# Altium footprint library mastermind.PCBLIB: 1061 footprints (part 48 of 67)
Each footprint in its own frame and in the unit in brackets; x right, y up, seen from the top. Pads: shape width x height; smd on the part's side, far side on the other; paste and mask are expansions set on the pad; w line width, h text height; cw(c..) or ccw(c..) is an arc to the next point about the centre after c.
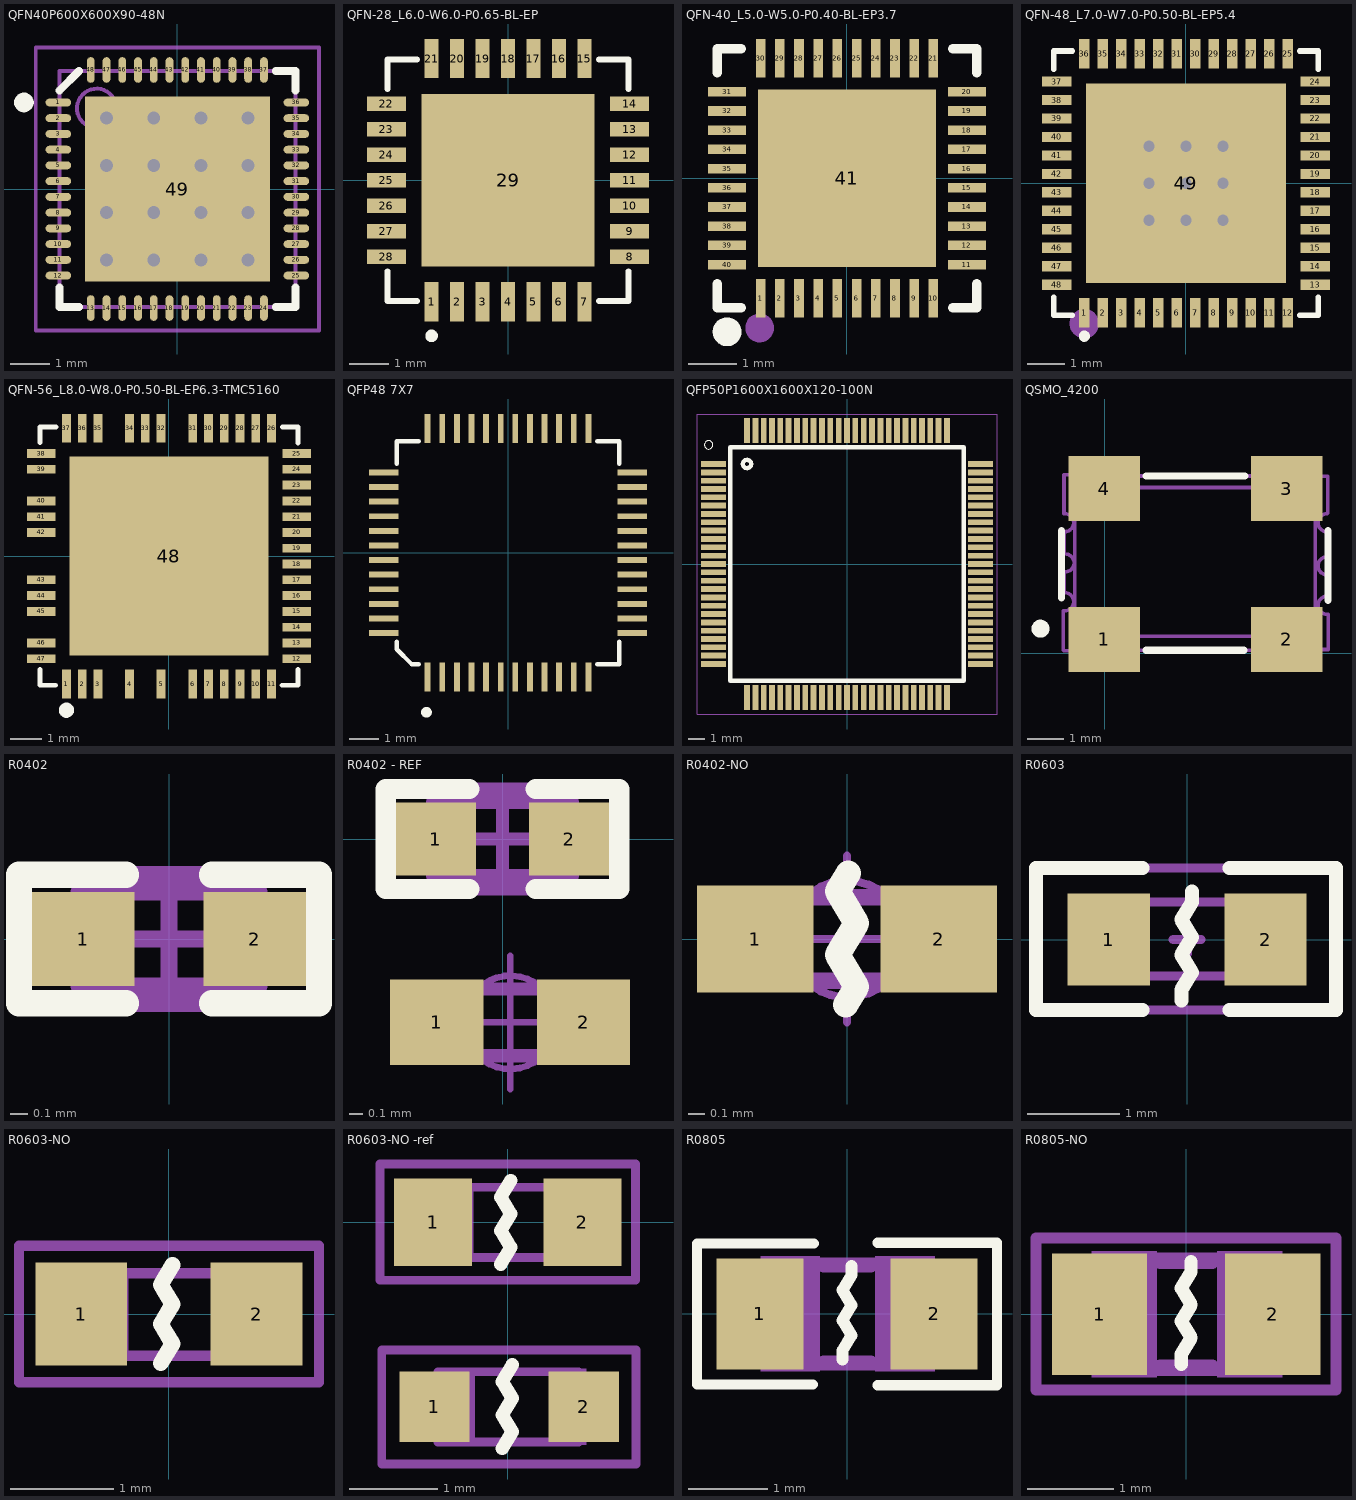
[diagram p47: the footprints below, top view; thin cyan lines are the x and y axes]

## QFN40P600X600X90-48N [mm]
pads (49):
  oval 0.65x0.2 smd: 1(-3.025,2.2) 2(-3.025,1.8) 3(-3.025,1.4) 4(-3.025,1) 5(-3.025,0.6) 6(-3.025,0.2) 7(-3.025,-0.2) 8(-3.025,-0.6) 9(-3.025,-1) 10(-3.025,-1.4) 11(-3.025,-1.8) 12(-3.025,-2.2) 25(3.025,-2.2) 26(3.025,-1.8) 27(3.025,-1.4) 28(3.025,-1) 29(3.025,-0.6) 30(3.025,-0.2) 31(3.025,0.2) 32(3.025,0.6) 33(3.025,1) 34(3.025,1.4) 35(3.025,1.8) 36(3.025,2.2)
  oval 0.2x0.65 smd: 13(-2.2,-3.025) 14(-1.8,-3.025) 15(-1.4,-3.025) 16(-1,-3.025) 17(-0.6,-3.025) 18(-0.2,-3.025) 19(0.2,-3.025) 20(0.6,-3.025) 21(1,-3.025) 22(1.4,-3.025) 23(1.8,-3.025) 24(2.2,-3.025) 37(2.2,3.025) 38(1.8,3.025) 39(1.4,3.025) 40(1,3.025) 41(0.6,3.025) 42(0.2,3.025) 43(-0.2,3.025) 44(-0.6,3.025) 45(-1,3.025) 46(-1.4,3.025) 47(-1.8,3.025) 48(-2.2,3.025)
  rect 4.7x4.7 smd: 49(0,0)
via 1.8,-1.8 diameter 0.66 hole 0.33
via 0.6,-1.8 diameter 0.66 hole 0.33
via -0.6,-1.8 diameter 0.66 hole 0.33
via -1.8,-1.8 diameter 0.66 hole 0.33
via 1.8,-0.6 diameter 0.66 hole 0.33
via 0.6,-0.6 diameter 0.66 hole 0.33
via -0.6,-0.6 diameter 0.66 hole 0.33
via -1.8,-0.6 diameter 0.66 hole 0.33
via 1.8,0.6 diameter 0.66 hole 0.33
via 0.6,0.6 diameter 0.66 hole 0.33
via -0.6,0.6 diameter 0.66 hole 0.33
via -1.8,0.6 diameter 0.66 hole 0.33
via 1.8,1.8 diameter 0.66 hole 0.33
via 0.6,1.8 diameter 0.66 hole 0.33
via -0.6,1.8 diameter 0.66 hole 0.33
via -1.8,1.8 diameter 0.66 hole 0.33
Top Overlay:
  circle w0.25: c-3.9,2.2 r0.125
  lines w0.2: -3,-2.5 -3,-3 -2.5,-3 ; -3,2.5 -2.5,3 ; 2.5,-3 3,-3 3,-2.5 ; 2.5,3 3,3 3,2.5
Mechanical 13:
  circle w0.1: c-2.05,2.05 r0.5
  lines w0.1: -3,-3 3,-3 3,3 -3,3 -3,-3
Mechanical 15:
  lines w0.1: -0.5,0 0.5,0 ; 0,-0.5 0,0.5 ; -3.6,-3.6 3.6,-3.6 3.6,3.6 -3.6,3.6 -3.6,-3.6
3D body "User Library-QFN48.step": height 0.86, standoff -0.01, extent -3.02,-3.02 3.02,3.02

## QFN-28_L6.0-W6.0-P0.65-BL-EP [mm]
pads (29):
  rect 0.364x1 smd: 1(-1.95,-3.1) 2(-1.3,-3.1) 3(-0.65,-3.1) 4(0,-3.1) 5(0.65,-3.1) 6(1.3,-3.1) 7(1.95,-3.1) 15(1.95,3.1) 16(1.3,3.1) 17(0.65,3.1) 18(0,3.1) 19(-0.65,3.1) 20(-1.3,3.1) 21(-1.95,3.1)
  rect 1x0.364 smd: 8(3.1,-1.95) 9(3.1,-1.3) 10(3.1,-0.65) 11(3.1,0) 12(3.1,0.65) 13(3.1,1.3) 14(3.1,1.95) 22(-3.1,1.95) 23(-3.1,1.3) 24(-3.1,0.65) 25(-3.1,0) 26(-3.1,-0.65) 27(-3.1,-1.3) 28(-3.1,-1.95)
  rect 4.4x4.4 smd: 29(0,0)
Top Overlay:
  circle w0.16: c-1.95,-3.97 r0.08
  lines w0.152: -3.076,-2.322 -3.076,-3.076 -2.322,-3.076 ; -3.076,2.322 -3.076,3.076 -2.322,3.076 ; 2.322,-3.076 3.076,-3.076 3.076,-2.322 ; 2.322,3.076 3.076,3.076 3.076,2.322
Mechanical 15:
  circle w0.16: c-1.95,-3.3 r0.08
3D body: height 1, standoff 0, extent -3.078,-3.076 3.076,3.077

## QFN-40_L5.0-W5.0-P0.40-BL-EP3.7 [mm]
pads (41):
  rect 0.2x0.8 smd: 1(-1.8,-2.499) 2(-1.4,-2.499) 3(-1,-2.499) 4(-0.6,-2.499) 5(-0.2,-2.499) 6(0.2,-2.499) 7(0.6,-2.499) 8(1,-2.499) 9(1.4,-2.499) 10(1.8,-2.499) 21(1.8,2.499) 22(1.4,2.499) 23(1,2.499) 24(0.6,2.499) 25(0.2,2.499) 26(-0.2,2.499) 27(-0.6,2.499) 28(-1,2.499) 29(-1.4,2.499) 30(-1.8,2.499)
  rect 0.8x0.2 smd: 11(2.499,-1.8) 12(2.499,-1.4) 13(2.499,-1) 14(2.499,-0.6) 15(2.499,-0.2) 16(2.499,0.2) 17(2.499,0.6) 18(2.499,1) 19(2.499,1.4) 20(2.499,1.8) 31(-2.499,1.8) 32(-2.499,1.4) 33(-2.499,1) 34(-2.499,0.6) 35(-2.499,0.2) 36(-2.499,-0.2) 37(-2.499,-0.6) 38(-2.499,-1) 39(-2.499,-1.4) 40(-2.499,-1.8)
  rect 3.7x3.7 smd: 41(0,0)
Top Overlay:
  lines w0.2: -2.7,-2.2 -2.7,-2.7 -2.2,-2.7 ; -2.7,2.2 -2.7,2.7 -2.2,2.7 ; 2.2,-2.7 2.7,-2.7 2.7,-2.2 ; 2.2,2.7 2.7,2.7 2.7,2.2
  lines w0.3: -2.499,-3.051 ccw(c-2.498,-3.201) -2.497,-3.051
Top Paste:
  drawing of 41 lines, arcs and shapes, not listed
Mechanical 15:
  circle w0.3: c-1.82,-3.12 r0.15
3D body: height 0.8, standoff 0, extent -2.7,-2.7 2.7,2.7

## QFN-48_L7.0-W7.0-P0.50-BL-EP5.4 [mm]
pads (49):
  rect 0.28x0.8 smd: 1(-2.75,-3.5) 2(-2.25,-3.5) 3(-1.75,-3.5) 4(-1.25,-3.5) 5(-0.75,-3.5) 6(-0.25,-3.5) 7(0.25,-3.5) 8(0.75,-3.5) 9(1.25,-3.5) 10(1.75,-3.5) 11(2.25,-3.5) 12(2.75,-3.5) 25(2.75,3.5) 26(2.25,3.5) 27(1.75,3.5) 28(1.25,3.5) 29(0.75,3.5) 30(0.25,3.5) 31(-0.25,3.5) 32(-0.75,3.5) 33(-1.25,3.5) 34(-1.75,3.5) 35(-2.25,3.5) 36(-2.75,3.5)
  rect 0.8x0.28 smd: 13(3.5,-2.75) 14(3.5,-2.25) 15(3.5,-1.75) 16(3.5,-1.25) 17(3.5,-0.75) 18(3.5,-0.25) 19(3.5,0.25) 20(3.5,0.75) 21(3.5,1.25) 22(3.5,1.75) 23(3.5,2.25) 24(3.5,2.75) 37(-3.5,2.75) 38(-3.5,2.25) 39(-3.5,1.75) 40(-3.5,1.25) 41(-3.5,0.75) 42(-3.5,0.25) 43(-3.5,-0.25) 44(-3.5,-0.75) 45(-3.5,-1.25) 46(-3.5,-1.75) 47(-3.5,-2.25) 48(-3.5,-2.75)
  rect 5.4x5.4 smd: 49(0,0)
via 0,-1 diameter 0.61 hole 0.305
via 0,1 diameter 0.61 hole 0.305
via -1,1 diameter 0.61 hole 0.305
via 1,1 diameter 0.61 hole 0.305
via 1,0 diameter 0.61 hole 0.305
via -1,-1 diameter 0.61 hole 0.305
via 1,-1 diameter 0.61 hole 0.305
via -1,0 diameter 0.61 hole 0.305
via 0,0 diameter 0.61 hole 0.305
Top Overlay:
  circle w0.15: c-2.75,-4.14 r0.075
  lines w0.152: -3.576,-3.08 -3.576,-3.576 -3.081,-3.576 ; -3.576,3.08 -3.576,3.576 -3.081,3.576 ; 3.08,-3.576 3.576,-3.576 3.576,-3.08 ; 3.08,3.576 3.576,3.576 3.576,3.08
Top Paste:
  drawing of 49 lines, arcs and shapes, not listed
Mechanical 15:
  circle w0.4: c-2.75,-3.8 r0.2
3D body: height 0.8, standoff 0, extent -3.576,-3.576 3.576,3.576

## QFN-56_L8.0-W8.0-P0.50-BL-EP6.3-TMC5160 [mm]
pads (48):
  rect 0.28x0.905 smd: 1(-3.25,-4.05) 2(-2.75,-4.05) 3(-2.25,-4.05) 4(-1.25,-4.05) 5(-0.25,-4.05) 6(0.75,-4.05) 7(1.25,-4.05) 8(1.75,-4.05) 9(2.25,-4.05) 10(2.75,-4.05) 11(3.25,-4.05) 26(3.25,4.05) 27(2.75,4.05) 28(2.25,4.05) 29(1.75,4.05) 30(1.25,4.05) 31(0.75,4.05) 32(-0.25,4.05) 33(-0.75,4.05) 34(-1.25,4.05) 35(-2.25,4.05) 36(-2.75,4.05) 37(-3.25,4.05)
  rect 0.905x0.28 smd: 12(4.05,-3.25) 13(4.05,-2.75) 14(4.05,-2.25) 15(4.05,-1.75) 16(4.05,-1.25) 17(4.05,-0.75) 18(4.05,-0.25) 19(4.05,0.25) 20(4.05,0.75) 21(4.05,1.25) 22(4.05,1.75) 23(4.05,2.25) 24(4.05,2.75) 25(4.05,3.25) 38(-4.05,3.25) 39(-4.05,2.75) 40(-4.05,1.75) 41(-4.05,1.25) 42(-4.05,0.75) 43(-4.05,-0.75) 44(-4.05,-1.25) 45(-4.05,-1.75) 46(-4.05,-2.75) 47(-4.05,-3.25)
  rect 6.3x6.3 smd: 48(0,0)
Top Overlay:
  circle w0.24: c-3.25,-4.88 r0.12
  lines w0.152: -4.09,-3.58 -4.09,-4.09 -3.59,-4.09 ; -4.09,3.59 -4.09,4.09 -3.58,4.09 ; 3.58,-4.09 4.09,-4.09 4.09,-3.59 ; 3.59,4.09 4.09,4.09 4.09,3.58
3D body: height 0.8, standoff 0, extent -4.09,-4.09 4.09,4.09

## QFP48 7X7 [mm]
height 2
pads (48):
  rect 0.2x1 smd: 1(-2.75,-4.25) 2(-2.25,-4.25) 3(-1.75,-4.25) 4(-1.25,-4.25) 5(-0.75,-4.25) 6(-0.25,-4.25) 7(0.25,-4.25) 8(0.75,-4.25) 9(1.25,-4.25) 10(1.75,-4.25) 11(2.25,-4.25) 12(2.75,-4.25) 25(2.75,4.25) 26(2.25,4.25) 27(1.75,4.25) 28(1.25,4.25) 29(0.75,4.25) 30(0.25,4.25) 31(-0.25,4.25) 32(-0.75,4.25) 33(-1.25,4.25) 34(-1.75,4.25) 35(-2.25,4.25) 36(-2.75,4.25)
  rect 1x0.2 smd: 13(4.25,-2.75) 14(4.25,-2.25) 15(4.25,-1.75) 16(4.25,-1.25) 17(4.25,-0.75) 18(4.25,-0.25) 19(4.25,0.25) 20(4.25,0.75) 21(4.25,1.25) 22(4.25,1.75) 23(4.25,2.25) 24(4.25,2.75) 37(-4.25,2.75) 38(-4.25,2.25) 39(-4.25,1.75) 40(-4.25,1.25) 41(-4.25,0.75) 42(-4.25,0.25) 43(-4.25,-0.25) 44(-4.25,-0.75) 45(-4.25,-1.25) 46(-4.25,-1.75) 47(-4.25,-2.25) 48(-4.25,-2.75)
Top Overlay:
  circle w0.25: c-2.792,-5.461 r0.059
  lines w0.152: -3.81,-3.048 -3.81,-3.302 -3.302,-3.81 -3.048,-3.81 ; -3.81,3.048 -3.81,3.81 -3.048,3.81 ; 3.048,-3.81 3.81,-3.81 3.81,-3.048 ; 3.048,3.81 3.81,3.81 3.81,3.048
3D body "TQFP48.step": height 1.02, standoff 0, extent -4.5,-4.501 4.5,4.508

## QFP50P1600X1600X120-100N [mm]
pads (100):
  rect 1.5x0.35 smd: 1(-8,6) 2(-8,5.5) 3(-8,5) 4(-8,4.5) 5(-8,4) 6(-8,3.5) 7(-8,3) 8(-8,2.5) 9(-8,2) 10(-8,1.5) 11(-8,1) 12(-8,0.5) 13(-8,0) 14(-8,-0.5) 15(-8,-1) 16(-8,-1.5) 17(-8,-2) 18(-8,-2.5) 19(-8,-3) 20(-8,-3.5) 21(-8,-4) 22(-8,-4.5) 23(-8,-5) 24(-8,-5.5) 25(-8,-6) 51(8,-6) 52(8,-5.5) 53(8,-5) 54(8,-4.5) 55(8,-4) 56(8,-3.5) 57(8,-3) 58(8,-2.5) 59(8,-2) 60(8,-1.5) 61(8,-1) 62(8,-0.5) 63(8,0) 64(8,0.5) 65(8,1) 66(8,1.5) 67(8,2) 68(8,2.5) 69(8,3) 70(8,3.5) 71(8,4) 72(8,4.5) 73(8,5) 74(8,5.5) 75(8,6)
  rect 0.35x1.5 smd: 26(-6,-8) 27(-5.5,-8) 28(-5,-8) 29(-4.5,-8) 30(-4,-8) 31(-3.5,-8) 32(-3,-8) 33(-2.5,-8) 34(-2,-8) 35(-1.5,-8) 36(-1,-8) 37(-0.5,-8) 38(0,-8) 39(0.5,-8) 40(1,-8) 41(1.5,-8) 42(2,-8) 43(2.5,-8) 44(3,-8) 45(3.5,-8) 46(4,-8) 47(4.5,-8) 48(5,-8) 49(5.5,-8) 50(6,-8) 76(6,8) 77(5.5,8) 78(5,8) 79(4.5,8) 80(4,8) 81(3.5,8) 82(3,8) 83(2.5,8) 84(2,8) 85(1.5,8) 86(1,8) 87(0.5,8) 88(0,8) 89(-0.5,8) 90(-1,8) 91(-1.5,8) 92(-2,8) 93(-2.5,8) 94(-3,8) 95(-3.5,8) 96(-4,8) 97(-4.5,8) 98(-5,8) 99(-5.5,8) 100(-6,8)
Top Overlay:
  circle w0: c-8.3,7.15 r0.254
  circle w0.254: c-6,6 r0.25
  lines w0.254: -7,-7 -7,7 7,7 7,-7 -7,-7
Mechanical 15:
  lines w0.05: -9,-9 -9,9 9,9 9,-9 -9,-9
3D body "step_temp.STEP": height 1.2, standoff 0, extent -8,-8 8,8

## QSMO_4200 [mm]
pads (4):
  rect 2x1.8 smd: 1(-0.009,0.39) 2(5.071,0.39) 3(5.071,4.59) 4(-0.009,4.59)
Top Overlay:
  circle w0.25: c-1.784,0.69 r0.125
  lines w0.2: -1.203,1.54 -1.203,3.419 ; 1.152,4.943 3.902,4.943 ; 1.159,0.092 3.877,0.092 ; 6.214,1.479 6.214,3.419
Mechanical 15:
  lines w0.1: -1.152,0.092 -1.152,1.184 ; -1.129,0.08 -0.279,0.08 -0.299,0.1 ; -1.129,3.89 -1.129,4.97 -0.269,4.97 ; -1.127,1.692 -1.127,2.276 ; -1.127,2.784 -1.127,3.369 ; -1.109,1.19 ccw(c-1.109,1.44) -1.109,1.69 ; -1.109,3.39 ccw(c-1.109,3.64) -1.109,3.89 ; -1.099,2.27 ccw(c-1.099,2.52) -1.099,2.77 ; -0.839,0.48 5.861,0.48 5.861,4.62 -0.829,4.62 -0.829,3.9 -0.829,0.5 ; -0.309,0.14 cw(c-0.059,0.14) 0.191,0.14 ; -0.239,4.9 ccw(c0.011,4.9) 0.261,4.9 ; 0.181,0.09 4.771,0.09 ; 0.241,4.94 4.861,4.94 ; 4.791,0.15 cw(c5.041,0.15) 5.291,0.15 ; 4.871,4.9 ccw(c5.121,4.9) 5.371,4.9 ; 5.281,0.11 6.221,0.11 6.221,1.09 ; 5.341,4.93 6.211,4.93 6.211,3.9 ; 6.188,1.61 6.188,2.175 ; 6.191,1.09 cw(c6.191,1.34) 6.191,1.59 ; 6.191,2.19 cw(c6.191,2.44) 6.191,2.69 ; 6.191,3.39 cw(c6.191,3.64) 6.191,3.89 ; 6.214,2.694 6.214,3.369
3D body: height 1.5, standoff 0, extent -1.143,0.127 6.096,4.953
3D body: height 0.75, standoff 0, extent -0.8,4 0.8,5.3
3D body: height 0.75, standoff 0, extent 4.28,4 5.88,5.3
3D body: height 0.75, standoff 0, extent -0.818,-0.319 0.782,0.981
3D body: height 0.75, standoff 0, extent 4.28,-0.2 5.88,1.1

## R0402 [mm]
pads (2):
  rect 0.6x0.55 smd: 1(-0.5,0) 2(0.5,0)
Top Overlay:
  lines w0.152: -0.25,-0.375 -0.875,-0.375 -0.875,0.375 -0.25,0.375 ; 0.25,-0.375 0.875,-0.375 0.875,0.375 0.25,0.375
Mechanical 13:
  lines w0.1: -0.525,-0.275 -0.525,0.275 0.525,0.275 0.525,-0.275 -0.525,-0.275
Mechanical 15:
  lines w0.1: -0.275,0 0.275,0 ; 0,-0.275 0,0.275 ; -0.875,-0.375 0.875,-0.375 0.875,0.375 -0.875,0.375 -0.875,-0.375
Top Assembly:
  text ".Designator" at -1.022,0.557 h0.75
3D body "User Library-res0402-1.step": height 0.3, standoff 0, extent -0.5,-0.25 0.5,0.25

## R0402 - REF [mm]
pads (4):
  rect 0.6x0.55 smd: 1(-0.5,0) 2(0.5,0)
  rect 0.7x0.64 smd: 1(-0.493,-1.375) 2(0.607,-1.375)
Top Overlay:
  lines w0.152: -0.25,-0.375 -0.875,-0.375 -0.875,0.375 -0.25,0.375 ; 0.25,-0.375 0.875,-0.375 0.875,0.375 0.25,0.375
Mechanical 13:
  lines w0.1: -0.525,-0.275 -0.525,0.275 0.525,0.275 0.525,-0.275 -0.525,-0.275
Mechanical 15:
  lines w0.1: -0.275,0 0.275,0 ; 0,-0.275 0,0.275 ; -0.875,-0.375 0.875,-0.375 0.875,0.375 -0.875,0.375 -0.875,-0.375
Top Component Center:
  circle w0.05: c0.057,-1.375 r0.35
  lines w0.05: -0.443,-1.375 0.557,-1.375 ; 0.057,-1.875 0.057,-0.875
Top 3D Body:
  lines w0.001: -0.443,-1.625 0.557,-1.625 0.557,-1.125 -0.443,-1.125 -0.443,-1.625
Top Dimensions:
  lines w0.1: -0.443,-1.625 0.557,-1.625 0.557,-1.125 -0.443,-1.125 -0.443,-1.625
3D body "User Library-res0402-1.step": height 0.3, standoff 0, extent -0.5,-0.25 0.5,0.25
3D body "User Library-R_0402.step": height 0.35, standoff 0, extent -0.442,-1.625 0.558,-1.125

## R0402-NO [mm]
pads (2):
  rect 0.7x0.64 smd: 1(-0.55,0) 2(0.55,0)
Top Overlay:
  lines w0.152: -0.008,-0.394 0.057,-0.286 -0.057,-0.095 0.057,0.095 -0.057,0.286 0.008,0.394
Top Component Center:
  circle w0.05: c0,0 r0.35
  lines w0.05: -0.5,0 0.5,0 ; 0,-0.5 0,0.5
Top 3D Body:
  lines w0.001: -0.5,-0.25 0.5,-0.25 0.5,0.25 -0.5,0.25 -0.5,-0.25
Top Dimensions:
  lines w0.1: -0.5,-0.25 0.5,-0.25 0.5,0.25 -0.5,0.25 -0.5,-0.25
Top Assembly:
  text ".Designator" at -0.94,0.85 h0.75
3D body "User Library-R_0402.step": height 0.35, standoff 0, extent -0.5,-0.25 0.5,0.25

## R0603 [mm]
pads (2):
  rect 0.889x1 smd: 1(-0.85,0) 2(0.85,0)
Top Overlay:
  lines w0.152: -0.483,-0.762 -1.638,-0.762 -1.638,0.775 -0.483,0.775 ; -0.063,-0.66 -0.063,-0.546 0.051,-0.356 -0.063,-0.165 0.051,0.025 -0.063,0.216 0.051,0.406 0.051,0.521 ; 0.457,-0.762 1.613,-0.762 1.613,0.775 0.457,0.775
Mechanical 8:
  region: 0.419,-0.432 0.419,0.431 0.826,0.431 0.826,-0.432
  region: -0.851,-0.432 -0.851,0.431 -0.444,0.431 -0.444,-0.432
Mechanical 13:
  lines w0.1: -0.15,0 0.15,0 ; 0,-0.15 0,0.15 ; -1.069,-0.394 -1.069,0.406 1.031,0.406 1.031,-0.394 -1.069,-0.394
Mechanical 15:
  lines w0.1: -1.638,-0.762 -1.638,0.775 1.613,0.775 1.613,-0.762 -1.638,-0.762
  text ".Designator" at -1.283,-0.257 h1
3D body "Resistor 0603.step": height 0.5, standoff 0, extent -1.069,-0.394 1.031,0.406

## R0603-NO [mm]
height 0.45
pads (2):
  rect 0.889x1 smd: 1(-0.85,0) 2(0.85,0)
Top Overlay:
  lines w0.152: -0.079,-0.476 0.035,-0.286 -0.079,-0.095 0.035,0.095 -0.079,0.286 0.035,0.476
Dimensions:
  lines w0.1: 0.781,-0.402 0.781,0.398 ; 0.791,-0.402 -0.809,-0.402 -0.809,0.398 0.791,0.398
  text ".Designator" at -1.23,-0.256 h1
Mechanical 8:
  region: 0.471,-0.431 0.471,0.433 0.878,0.433 0.878,-0.431
  region: -0.799,-0.431 -0.799,0.433 -0.392,0.433 -0.392,-0.431
Mechanical 15:
  lines w0.1: -1.454,-0.66 1.456,-0.66 1.456,0.664 -1.454,0.664 -1.454,-0.66
3D body "Resistor 0603.step": height 0.5, standoff 0, extent -1.057,-0.402 1.043,0.398

## R0603-NO -ref [mm]
height 0.45
pads (4):
  rect 0.889x1 smd: 1(-0.85,0) 2(0.85,0)
  rect 0.8x0.8 smd: 1(-0.835,-2.1) 2(0.865,-2.1)
Top Overlay:
  lines w0.152: -0.079,-0.476 0.035,-0.286 -0.079,-0.095 0.035,0.095 -0.079,0.286 0.035,0.476 ; -0.064,-2.576 0.05,-2.386 -0.064,-2.195 0.05,-2.005 -0.064,-1.814 0.05,-1.624
Dimensions:
  lines w0.1: 0.781,-0.402 0.781,0.398 ; 0.791,-0.402 -0.809,-0.402 -0.809,0.398 0.791,0.398 ; 0.796,-2.503 0.796,-1.703 ; 0.806,-2.503 -0.794,-2.503 -0.794,-1.703 0.806,-1.703
  text ".Designator" at -1.215,-2.356 h1
  text ".Designator" at -1.23,-0.256 h1
Mechanical 8:
  region: 0.486,-2.531 0.486,-1.668 0.893,-1.668 0.893,-2.531
  region: -0.784,-2.531 -0.784,-1.668 -0.377,-1.668 -0.377,-2.531
  region: 0.471,-0.431 0.471,0.433 0.878,0.433 0.878,-0.431
  region: -0.799,-0.431 -0.799,0.433 -0.392,0.433 -0.392,-0.431
Mechanical 15:
  lines w0.1: -1.454,-0.66 1.456,-0.66 1.456,0.664 -1.454,0.664 -1.454,-0.66 ; -1.434,-2.753 1.459,-2.753 1.459,-1.455 -1.434,-1.455 -1.434,-2.753
3D body "Resistor 0603.step": height 0.5, standoff 0, extent -1.042,-2.503 1.058,-1.703
3D body "Resistor 0603.step": height 0.5, standoff 0, extent -1.057,-0.402 1.043,0.398

## R0805 [mm]
pads (2):
  rect 1.1x1.4 smd: 1(-1.1,0) 2(1.1,0)
Top Overlay:
  lines w0.127: -0.429,-0.892 -1.894,-0.892 -1.894,0.892 -0.418,0.892 ; 0.386,-0.9 1.894,-0.9 1.894,0.899 0.386,0.899
  lines w0.152: -0.057,-0.575 -0.057,-0.461 0.057,-0.271 -0.057,-0.08 0.057,0.11 -0.057,0.301 0.057,0.491 0.057,0.606
Mechanical 2:
  region: 0.406,-0.699 0.406,0.702 1.056,0.702 1.056,-0.699
  region: -1.067,-0.699 -1.067,0.702 -0.417,0.702 -0.417,-0.699
Mechanical 8:
  region: 0.356,-0.724 0.356,0.726 1.106,0.726 1.106,-0.724
  region: -1.092,-0.724 -1.092,0.726 -0.342,0.726 -0.342,-0.724
  lines w0.102: -0.381,0.66 0.381,0.66 ; -0.356,-0.66 0.381,-0.66
  lines w0.152: -0.41,-0.635 0.41,-0.635 ; -0.41,0.635 0.41,0.635
Mechanical 22:
  lines w0.152: -0.298,-0.6 0.302,-0.6 ; -0.298,0.6 0.302,0.6
3D body "Resistor_0805_Text.step": height 0.52, standoff 0.01, extent -1,-0.61 1,0.64

## R0805-NO [mm]
pads (2):
  rect 1.1x1.4 smd: 1(-1,0) 2(1,0)
Top Overlay:
  lines w0.152: -0.057,-0.575 -0.057,-0.461 0.057,-0.271 -0.057,-0.08 0.057,0.11 -0.057,0.301 0.057,0.491 0.057,0.606
Mechanical 2:
  region: 0.406,-0.699 0.406,0.702 1.056,0.702 1.056,-0.699
  region: -1.067,-0.699 -1.067,0.702 -0.417,0.702 -0.417,-0.699
Dimensions:
  lines w0.1: -1.033,0.611 -1.033,-0.639 1.055,-0.639 1.055,0.611 ; -1.033,0.615 1.055,0.615
  text ".Designator" at -0.87,-0.223 h1
Mechanical 8:
  region: 0.356,-0.724 0.356,0.726 1.106,0.726 1.106,-0.724
  region: -1.092,-0.724 -1.092,0.726 -0.342,0.726 -0.342,-0.724
  lines w0.102: -0.381,0.66 0.381,0.66 ; -0.356,-0.66 0.381,-0.66
  lines w0.152: -0.41,-0.635 0.41,-0.635 ; -0.41,0.635 0.41,0.635
Mechanical 15:
  lines w0.127: -1.733,-0.874 -1.733,0.881 1.729,0.881 1.729,-0.874 -1.733,-0.874
Mechanical 22:
  lines w0.152: -0.298,-0.6 0.302,-0.6 ; -0.298,0.6 0.302,0.6
3D body "Resistor_0805_Text.step": height 0.52, standoff 0.01, extent -1,-0.61 1,0.64